# Altium footprint library Generic Footprint.PcbLib: 160 footprints (part 11 of 20) (continued)
## Symbol_CE-Logo-9x6mm_Silkscreen [mil] (continued)
1(275.88,57.87) 1(275.88,58.22) 1(275.88,198.89) 1(275.88,199.25) 1(275.88,199.6) 1(276.24,16.06) 1(276.24,199.96) 1(276.24,240.71) 1(276.24,241.06) 1(276.59,15.71) 1(276.59,199.96) 1(276.59,241.41) 1(276.94,199.96) 1(276.94,200.31) 1(276.94,200.66) 1(277.3,15.35) 1(277.3,201.02) 1(277.66,201.02) 1(278.01,56.45) 1(278.01,56.81) 1(278.36,56.1) 1(278.36,241.77) 1(278.72,242.12) 1(279.07,201.02) 1(279.07,201.73) 1(279.07,242.48) 1(279.07,242.83) 1(279.43,14.29) 1(279.43,14.64) 1(279.43,14.99) 1(279.43,55.04) 1(279.43,55.39) 1(279.43,55.74) 1(279.43,201.37) 1(279.43,202.08) 1(279.43,242.83) 1(279.78,14.29) 1(279.78,202.08) 1(280.13,14.29) 1(280.49,202.08) 1(280.49,202.44) 1(280.49,202.79) 1(280.49,203.15) 1(281.2,54.68) 1(281.55,53.97) 1(281.55,54.33) 1(281.55,242.83) 1(281.91,13.58) 1(281.91,13.93) 1(281.91,243.18) 1(281.91,243.54) 1(282.26,13.22) 1(282.61,203.5) 1(282.61,203.85) 1(282.61,204.21) 1(282.61,243.89) 1(282.97,53.62) 1(283.68,53.26) 1(284.03,52.91) 1(284.39,52.55) 1(284.39,244.25) 1(284.39,244.6) 1(284.74,52.55) 1(284.74,204.56) 1(285.1,12.87) 1(285.1,51.49) 1(285.1,51.85) 1(285.1,52.2) 1(285.1,52.55) 1(285.1,204.92) 1(285.1,205.27) 1(285.1,205.63) 1(285.1,244.96) 1(285.45,12.16) 1(285.45,12.52) 1(285.45,205.63) 1(286.16,205.63) 1(287.22,50.43) 1(287.22,50.78) 1(287.22,51.14) 1(287.22,205.98) 1(287.22,206.33) 1(287.58,245.31) 1(287.58,245.66) 1(287.93,206.69) 1(287.93,246.02) 1(288.64,11.1) 1(288.64,11.45) 1(288.64,11.81) 1(288.99,207.04) 1(289.7,10.74) 1(289.7,49.37) 1(289.7,49.72) 1(289.7,50.07) 1(289.7,207.4) 1(290.05,207.75) 1(290.77,246.37) 1(290.77,246.73) 1(291.12,49.01) 1(291.47,49.01) 1(291.47,110.66) 1(291.47,247.08) 1(291.83,48.3) 1(291.83,48.66) 1(291.83,49.01) 1(291.83,110.66) 1(291.83,208.11) 1(291.83,208.46) 1(292.18,10.04) 1(292.18,10.39) 1(292.18,208.82) 1(293.24,110.66) 1(293.6,9.68) 1(293.6,110.66) 1(293.95,209.17) 1(293.95,209.52) 1(293.95,209.88) 1(293.95,247.44) 1(294.31,47.95) 1(294.31,247.44) 1(295.02,47.6) 1(295.37,9.33) 1(295.37,46.88) 1(295.37,47.24) 1(295.37,247.44) 1(295.37,247.79) 1(295.37,248.15) 1(295.72,8.97) 1(295.72,210.23) 1(296.08,46.88) 1(296.08,110.66) 1(296.08,210.23) 1(296.43,110.66) 1(296.79,8.62) 1(296.79,46.88) 1(296.79,210.23) 1(297.14,8.62) 1(297.14,248.5) 1(297.5,210.59) 1(297.85,8.62) 1(297.85,46.53) 1(297.85,210.94) 1(298.56,45.82) 1(298.56,46.18) 1(298.91,248.85) 1(299.27,211.3) 1(299.98,8.26) 1(300.33,7.91) 1(300.33,249.21) 1(300.69,45.47) 1(300.69,211.65) 1(301.04,212) 1(301.04,249.56) 1(302.1,7.55) 1(302.1,44.76) 1(302.1,45.11) 1(302.1,212.36) 1(303.88,212.71) 1(304.23,213.07) 1(304.58,213.42) 1(304.58,249.92) 1(304.94,44.41) 1(304.94,213.42) 1(304.94,250.27) 1(305.29,213.42) 1(305.65,6.85) 1(305.65,7.2) 1(305.65,43.7) 1(305.65,44.05) 1(306.36,250.63) 1(306.71,6.14) 1(306.71,6.49) 1(307.06,6.14) 1(307.06,6.49) 1(307.42,6.14) 1(307.42,6.49) 1(308.13,6.14) 1(308.13,213.77) 1(308.48,213.42) 1(308.48,213.77) 1(308.83,213.42) 1(308.83,213.77) 1(308.83,214.13) 1(308.83,214.49) 1(309.55,43.34) 1(309.9,6.14) 1(310.61,42.99) 1(311.32,5.78) 1(311.32,42.28) 1(311.32,42.63) 1(311.32,250.98) 1(311.32,251.33) 1(311.32,251.69) 1(311.67,5.78) 1(312.02,5.43) 1(312.02,5.78) 1(312.02,251.69) 1(312.38,5.43) 1(312.38,5.78) 1(312.38,6.14) 1(312.73,6.14) 1(312.73,42.28) 1(312.73,214.84) 1(313.09,6.14) 1(313.09,42.28) 1(313.09,251.69) 1(313.44,6.14) 1(313.44,42.28) 1(314.15,42.28) 1(314.5,42.28) 1(314.5,142.91) 1(314.5,143.62) 1(314.86,5.78) 1(315.21,42.28) 1(315.21,111.02) 1(315.21,111.37) 1(315.21,111.73) 1(315.21,112.08) 1(315.21,112.44) 1(315.21,112.79) 1(315.21,113.15) 1(315.21,113.5) 1(315.21,113.85) 1(315.21,114.21) 1(315.21,114.56) 1(315.21,114.92) 1(315.21,115.27) 1(315.21,115.63) 1(315.21,115.98) 1(315.21,116.33) 1(315.21,116.69) 1(315.21,117.04) 1(315.21,117.4) 1(315.21,117.75) 1(315.21,118.11) 1(315.21,118.46) 1(315.21,118.82) 1(315.21,119.17) 1(315.21,119.52) 1(315.21,119.88) 1(315.21,120.23) 1(315.21,120.59) 1(315.21,120.94) 1(315.21,121.3) 1(315.21,121.65) 1(315.21,122) 1(315.21,122.36) 1(315.21,122.71) 1(315.21,123.07) 1(315.21,123.42) 1(315.21,123.77) 1(315.21,124.13) 1(315.21,124.49) 1(315.21,124.84) 1(315.21,125.19) 1(315.21,125.55) 1(315.21,125.9) 1(315.21,126.26) 1(315.21,126.61) 1(315.21,126.96) 1(315.21,127.32) 1(315.21,127.67) 1(315.21,128.03) 1(315.21,128.38) 1(315.21,128.74) 1(315.21,129.09) 1(315.21,129.44) 1(315.21,129.8) 1(315.21,130.15) 1(315.21,130.51) 1(315.21,130.86) 1(315.21,131.22) 1(315.21,131.57) 1(315.21,131.93) 1(315.21,132.28) 1(315.21,132.63) 1(315.21,132.99) 1(315.21,133.34) 1(315.21,133.7) 1(315.21,134.05) 1(315.21,134.41) 1(315.21,134.76) 1(315.21,135.11) 1(315.21,135.47) 1(315.21,135.82) 1(315.21,136.18) 1(315.21,136.53) 1(315.21,136.88) 1(315.21,137.24) 1(315.21,137.6) 1(315.21,137.95) 1(315.21,138.3) 1(315.21,138.66) 1(315.21,139.01) 1(315.21,139.37) 1(315.21,139.72) 1(315.21,140.07) 1(315.21,140.43) 1(315.21,140.78) 1(315.21,141.14) 1(315.21,141.49) 1(315.21,141.85) 1(315.21,142.2) 1(315.21,142.55) 1(315.21,143.26) 1(315.21,143.97) 1(315.21,144.33) 1(315.21,144.68) 1(315.21,145.04) 1(315.21,145.39) 1(315.21,145.74) 1(315.21,146.1) 1(315.21,146.45) 1(315.21,146.81) 1(315.57,215.19) 1(315.92,215.55) 1(316.99,42.28) 1(316.99,215.9) 1(317.34,215.9) 1(318.05,5.43) 1(318.05,41.93) 1(318.05,42.28) 1(319.11,252.04) 1(320.17,5.07) 1(320.17,41.57) 1(320.53,41.22) 1(320.53,252.04) 1(320.88,5.07) 1(320.88,215.9) 1(321.24,5.07) 1(321.24,215.9) 1(321.59,215.55) 1(321.94,252.04) 1(322.3,252.04) 1(322.66,5.07) 1(322.66,215.55) 1(322.66,252.04) 1(323.01,5.07) 1(323.01,215.9) 1(323.36,5.07) 1(323.72,5.07) 1(323.72,41.22) 1(324.07,4.72) 1(324.43,4.72) 1(324.43,252.04) 1(325.49,252.04) 1(326.2,252.04) 1(327.26,252.04) 1(329.39,252.4) 1(330.1,4.72) 1(330.45,4.72) 1(330.45,252.4) 1(330.8,5.07) 1(330.8,252.04) 1(331.16,5.07) 1(331.16,252.04) 1(331.51,252.04) 1(331.87,252.04) 1(332.58,215.9) 1(332.93,41.22) 1(332.93,215.55) 1(333.99,41.22) 1(334.35,5.07) 1(334.35,41.57) 1(334.35,215.55) 1(334.35,215.9) 1(334.7,215.9) 1(335.05,252.04) 1(335.41,5.07) 1(335.77,5.07) 1(336.12,252.04) 1(336.47,41.93) 1(336.47,42.28) 1(336.47,252.04) 1(337.54,42.28) 1(337.89,5.43) 1(339.31,5.78) 1(339.31,6.14) 1(339.31,6.49) 1(339.31,6.85) 1(339.31,7.2) 1(339.31,7.55) 1(339.31,7.91) 1(339.31,8.26) 1(339.31,8.62) 1(339.31,8.97) 1(339.31,9.33) 1(339.31,9.68) 1(339.31,10.04) 1(339.31,10.39) 1(339.31,10.74) 1(339.31,11.1) 1(339.31,11.45) 1(339.31,11.81) 1(339.31,12.16) 1(339.31,12.52) 1(339.31,12.87) 1(339.31,13.22) 1(339.31,13.58) 1(339.31,13.93) 1(339.31,14.29) 1(339.31,14.64) 1(339.31,14.99) 1(339.31,15.35) 1(339.31,15.71) 1(339.31,16.06) 1(339.31,16.41) 1(339.31,16.77) 1(339.31,17.12) 1(339.31,17.48) 1(339.31,17.83) 1(339.31,18.18) 1(339.31,18.54) 1(339.31,18.89) 1(339.31,19.25) 1(339.31,19.6) 1(339.31,19.96) 1(339.31,20.31) 1(339.31,20.66) 1(339.31,21.02) 1(339.31,21.37) 1(339.31,21.73) 1(339.31,22.08) 1(339.31,22.44) 1(339.31,22.79) 1(339.31,23.15) 1(339.31,23.5) 1(339.31,24.21) 1(339.31,24.56) 1(339.31,24.92) 1(339.31,25.63) 1(339.31,25.98) 1(339.31,26.33) 1(339.31,26.69) 1(339.31,27.04) 1(339.31,27.4) 1(339.31,28.11) 1(339.31,28.46) 1(339.31,28.82) 1(339.31,29.17) 1(339.31,29.52) 1(339.31,29.88) 1(339.31,30.23) 1(339.31,30.59) 1(339.31,30.94) 1(339.31,31.3) 1(339.31,31.65) 1(339.31,32) 1(339.31,32.36) 1(339.31,32.71) 1(339.31,33.07) 1(339.31,33.42) 1(339.31,33.77) 1(339.31,34.13) 1(339.31,34.49) 1(339.31,34.84) 1(339.31,35.19) 1(339.31,35.55) 1(339.31,35.9) 1(339.31,36.26) 1(339.31,36.61) 1(339.31,36.96) 1(339.31,37.32) 1(339.31,37.67) 1(339.31,38.03) 1(339.31,38.38) 1(339.31,38.74) 1(339.31,39.09) 1(339.31,39.44) 1(339.31,39.8) 1(339.31,40.15) 1(339.31,40.51) 1(339.31,40.86) 1(339.31,41.22) 1(339.31,41.57) 1(339.31,41.93) 1(339.66,23.85) 1(339.66,25.27) 1(339.66,27.75) 1(339.66,215.9) 1(339.66,216.61) 1(339.66,216.96) 1(339.66,217.32) 1(339.66,218.03) 1(339.66,218.38) 1(339.66,218.74) 1(339.66,219.09) 1(339.66,219.44) 1(339.66,219.8) 1(339.66,220.15) 1(339.66,220.51) 1(339.66,220.86) 1(339.66,221.22) 1(339.66,221.57) 1(339.66,221.93) 1(339.66,222.28) 1(339.66,222.63) 1(339.66,222.99) 1(339.66,223.34) 1(339.66,223.7) 1(339.66,224.05) 1(339.66,224.41) 1(339.66,224.76) 1(339.66,225.11) 1(339.66,225.47) 1(339.66,225.82) 1(339.66,226.18) 1(339.66,226.53) 1(339.66,226.88) 1(339.66,227.24) 1(339.66,227.6) 1(339.66,227.95) 1(339.66,228.3) 1(339.66,229.01) 1(339.66,229.37) 1(339.66,229.72) 1(339.66,230.07) 1(339.66,230.43) 1(339.66,230.78) 1(339.66,231.14) 1(339.66,231.85) 1(339.66,232.2) 1(339.66,232.55) 1(339.66,233.26) 1(339.66,233.62) 1(339.66,233.97) 1(339.66,234.33) 1(339.66,235.04) 1(339.66,235.39) 1(339.66,235.74) 1(339.66,236.1) 1(339.66,236.45) 1(339.66,236.81) 1(339.66,237.16) 1(339.66,237.87) 1(339.66,238.22) 1(339.66,238.58) 1(339.66,238.93) 1(339.66,239.29) 1(339.66,239.64) 1(339.66,239.99) 1(339.66,240.35) 1(339.66,240.71) 1(339.66,241.06) 1(339.66,241.41) 1(339.66,242.12) 1(339.66,242.48) 1(339.66,242.83) 1(339.66,243.54) 1(339.66,243.89) 1(339.66,244.25) 1(339.66,244.6) 1(339.66,244.96) 1(339.66,245.31) 1(339.66,245.66) 1(339.66,246.37) 1(339.66,246.73) 1(339.66,247.08) 1(339.66,247.44) 1(339.66,248.15) 1(339.66,248.5) 1(339.66,248.85) 1(339.66,249.21) 1(339.66,249.92) 1(339.66,250.27) 1(339.66,250.63) 1(339.66,250.98) 1(339.66,251.33) 1(339.66,251.69) 1(340.02,216.26) 1(340.02,217.67) 1(340.02,228.66) 1(340.02,231.49) 1(340.02,232.91) 1(340.02,234.68) 1(340.02,237.52) 1(340.02,241.77) 1(340.02,243.18) 1(340.02,246.02) 1(340.02,247.79) 1(340.02,249.56)
Top Overlay:
  drawing of 1554 lines, arcs and shapes, not listed